# Altium footprint library General.PCBLIB: 130 footprints (part 1 of 9)
Each footprint in its own frame and in the unit in brackets; x right, y up, seen from the top. Pads: shape width x height; smd on the part's side, far side on the other; paste and mask are expansions set on the pad; w line width, h text height; cw(c..) or ccw(c..) is an arc to the next point about the centre after c.
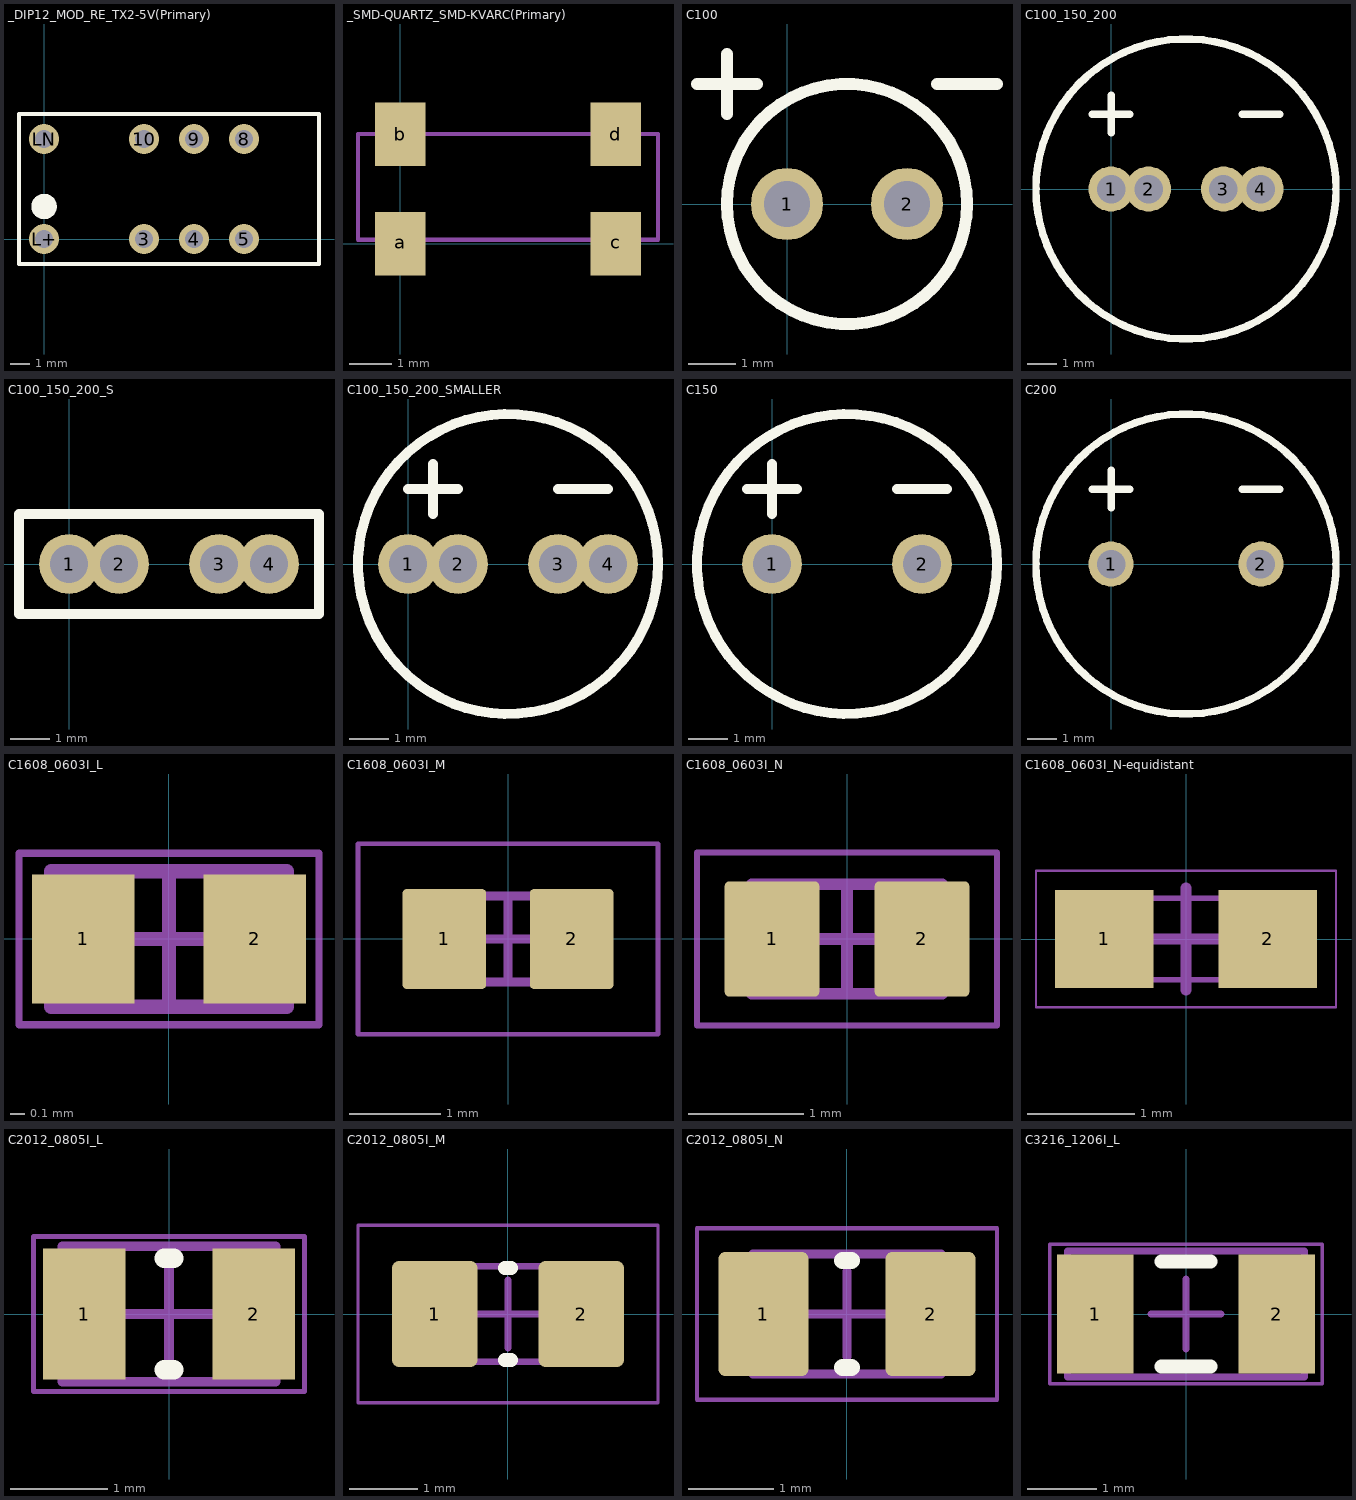
[diagram p0: the footprints below, top view; thin cyan lines are the x and y axes]

## _DIP12_MOD_RE_TX2-5V(Primary) [mil]
pads (8):
  round 60 hole 36: 3(200,0) 4(300,0) 5(400,0) 8(400,200) 9(300,200) 10(200,200) L+(0,0) LN(0,200)
Top Overlay:
  circle w25: c0,65 r13
  lines w8: -50,-50 -50,250 550,250 550,-50 -50,-50
Top DesignatorDoc:
  text ".Designator" at 100,100 h47.24

## _SMD-QUARTZ_SMD-KVARC(Primary) [mm]
pads (4):
  rect 1.2x1.5 smd: a(0,0) b(0,2.6) c(5.1,0) d(5.1,2.6)
Board Outline:
  lines w0.1: -1,0.1 -1,2.6 6.1,2.6 6.1,0.1 -1,0.1
Top DesignatorDoc:
  text ".Designator" at 2.54,1.27 h1.2

## C100 [mil]
pads (2):
  round 60 hole 38: 1(0,0) 2(100,0)
Top Overlay:
  circle w10: c50,0 r100
  lines w10: -75,100 -25,100 ; -50,75 -50,125 ; 125,100 175,100
Top DesignatorDoc:
  text ".Designator" at 50,0 h47.24

## C100_150_200 [mil]
pads (4):
  round 60 hole 38: 1(0,0) 2(50,0) 3(150,0) 4(200,0)
Top Overlay:
  circle w10: c100,0 r200
  lines w10: -25,100 25,100 ; 0,75 0,125 ; 175,100 225,100
Top DesignatorDoc:
  text ".Designator" at 100,0 h47.24

## C100_150_200_S [mil]
pads (4):
  round 60 hole 38: 1(0,0) 2(50,0) 3(150,0) 4(200,0)
Top Overlay:
  lines w10: -50,-50 -50,50 250,50 250,-50 -50,-50
Top DesignatorDoc:
  text ".Designator" at 100,0 h47.24

## C100_150_200_SMALLER [mil]
pads (4):
  round 60 hole 38: 1(0,0) 2(50,0) 3(150,0) 4(200,0)
Top Overlay:
  circle w10: c100,0 r150
  lines w10: 0,75 50,75 ; 25,50 25,100 ; 150,75 200,75
Top DesignatorDoc:
  text ".Designator" at 100,0 h47.24

## C150 [mil]
pads (2):
  round 60 hole 38: 1(0,0) 2(150,0)
Top Overlay:
  circle w10: c75,0 r150
  lines w10: -25,75 25,75 ; 0,50 0,100 ; 125,75 175,75
Top DesignatorDoc:
  text ".Designator" at 75,0 h47.24

## C200 [mil]
pads (2):
  round 60 hole 38: 1(0,0) 2(200,0)
Top Overlay:
  circle w10: c100,0 r200
  lines w10: -25,100 25,100 ; 0,75 0,125 ; 175,100 225,100
Top DesignatorDoc:
  text ".Designator" at 100,0 h47.24

## C1608_0603I_L [mm] "Chip Capacitor, 2-Leads, Body 1.57x0.85mm, IPC High Density"
height 0.95
pads (2):
  rect 0.72x0.9 smd: 1(-0.6,0) 2(0.6,0)
Top Body, 3D Models:
  lines w0.1: -0.825,-0.475 0.825,-0.475 0.825,0.475 -0.825,0.475 -0.825,-0.475
Top Courtyard:
  lines w0.05: -1.05,-0.6 1.05,-0.6 1.05,0.6 -1.05,0.6 -1.05,-0.6
  lines w0.1: -0.475,0 0.475,0 ; 0,-0.475 0,0.475
Top DesignatorDoc:
  text ".Designator" at 0,0 h1.2
3D body "C0603(1608)_L.step": height 0.95, standoff 0, extent -0.825,-0.475 0.825,0.475

## C1608_0603I_M [mm] "Chip Capacitor, 2-Leads, Body 1.57x0.85mm, IPC Low Density"
height 0.95
pads (2):
  rrect10% 0.92x1.1 smd: 1(-0.7,0) 2(0.7,0)
Top Body, 3D Models:
  lines w0.1: -0.825,-0.475 -0.825,0.475 0.825,0.475 0.825,-0.475 -0.825,-0.475
Top Courtyard:
  lines w0.05: -1.65,-1.05 -1.65,1.05 1.65,1.05 1.65,-1.05 -1.65,-1.05
  lines w0.1: -0.475,0 0.475,0 ; 0,-0.475 0,0.475
Top DesignatorDoc:
  text ".Designator" at 0,0 h1.2
3D body "C0603(1608)_M.step": height 0.95, standoff 0, extent -0.825,-0.475 0.825,0.475

## C1608_0603I_N [mm] "Chip Capacitor, 2-Leads, Body 1.57x0.85mm, IPC Medium Density"
height 0.95
pads (2):
  rrect10% 0.82x1 smd: 1(-0.65,0) 2(0.65,0)
Top Body, 3D Models:
  lines w0.1: -0.825,-0.475 -0.825,0.475 0.825,0.475 0.825,-0.475 -0.825,-0.475
Top Courtyard:
  lines w0.05: -1.3,-0.75 -1.3,0.75 1.3,0.75 1.3,-0.75 -1.3,-0.75
  lines w0.1: -0.475,0 0.475,0 ; 0,-0.475 0,0.475
Top DesignatorDoc:
  text ".Designator" at 0,0 h1.2
3D body "C0603N.step": height 0.95, standoff 0, extent -0.825,-0.475 0.825,0.475

## C1608_0603I_N-equidistant [mil] "Chip Capacitor, 2-Leads, Body 1.57x0.85mm, IPC Medium Density"
height 37.4
pads (2):
  rect 36x36 smd: 1(-30,0.01) 2(30,0.01)
Top Body, 3D Models:
  lines w2: -30,-15 30,-15 30,15 -30,15 -30,-15
Top Courtyard:
  lines w0.79: -55,-25 -55,25 55,25 55,-25 -55,-25
  lines w3.94: -18.7,0 18.7,0 ; 0,-18.7 0,18.7
Top DesignatorDoc:
  text ".Designator" at 0,0 h47.24
3D body "C0603(1608)_M.step": height 37.4, standoff 0, extent -32.48,-18.7 32.48,18.7

## C2012_0805I_L [mm] "Chip Capacitor, 2-Leads, Body 2.05x1.25mm, IPC High Density"
height 1.4
pads (2):
  rect 0.85x1.35 smd: 1(-0.875,0) 2(0.875,0)
Top Overlay:
  lines w0.2: -0.05,-0.575 0.05,-0.575 ; -0.05,0.575 0.05,0.575
Top Body, 3D Models:
  lines w0.1: -1.1,-0.7 -1.1,0.7 1.1,0.7 1.1,-0.7 -1.1,-0.7
Top Courtyard:
  lines w0.05: -1.4,-0.8 -1.4,0.8 1.4,0.8 1.4,-0.8 -1.4,-0.8
  lines w0.1: -0.5,0 0.5,0 ; 0,-0.5 0,0.5
Top DesignatorDoc:
  text ".Designator" at 0,0 h1.2
3D body "C0805_L.step": height 1.4, standoff 0, extent -1.1,-0.7 1.1,0.7

## C2012_0805I_M [mm] "Chip Capacitor, 2-Leads, Body 2.05x1.25mm, IPC Low Density"
height 1.4
pads (2):
  rrect15% 1.25x1.55 smd: 1(-1.075,0) 2(1.075,0)
Top Overlay:
  lines w0.2: -0.05,-0.675 0.05,-0.675 ; -0.05,0.675 0.05,0.675
Top Body, 3D Models:
  lines w0.1: -1.1,-0.7 1.1,-0.7 1.1,0.7 -1.1,0.7 -1.1,-0.7
Top Courtyard:
  lines w0.05: -2.2,-1.3 2.2,-1.3 2.2,1.3 -2.2,1.3 -2.2,-1.3
  lines w0.1: -0.5,0 0.5,0 ; 0,-0.5 0,0.5
Top DesignatorDoc:
  text ".Designator" at 0,0 h1.2
3D body "C0805_M.step": height 1.4, standoff 0, extent -1.1,-0.7 1.1,0.7

## C2012_0805I_N [mm] "Chip Capacitor, 2-Leads, Body 2.05x1.25mm, IPC Medium Density"
height 1.4
pads (2):
  rrect15% 1.05x1.45 smd: 1(-0.975,0) 2(0.975,0)
Top Overlay:
  lines w0.2: -0.05,-0.625 0.05,-0.625 ; -0.05,0.625 0.05,0.625
Top Body, 3D Models:
  lines w0.1: -1.1,-0.7 -1.1,0.7 1.1,0.7 1.1,-0.7 -1.1,-0.7
Top Courtyard:
  lines w0.05: -1.75,-1 -1.75,1 1.75,1 1.75,-1 -1.75,-1
  lines w0.1: -0.5,0 0.5,0 ; 0,-0.5 0,0.5
Top DesignatorDoc:
  text ".Designator" at 0,0 h1.2
3D body "C0805_N.step": height 1.4, standoff 0, extent -1.1,-0.7 1.1,0.7

## C3216_1206I_L [mm] "Chip Capacitor, 2-Leads, Body 3.20x1.60mm, IPC High Density"
height 1.8
pads (2):
  rect 1.1x1.7 smd: 1(-1.3,0) 2(1.3,0)
Top Overlay:
  lines w0.2: -0.35,-0.75 0.35,-0.75 ; -0.35,0.75 0.35,0.75
Top Body, 3D Models:
  lines w0.1: -1.7,-0.9 -1.7,0.9 1.7,0.9 1.7,-0.9 -1.7,-0.9
Top Courtyard:
  lines w0.05: -1.95,-1 -1.95,1 1.95,1 1.95,-1 -1.95,-1
  lines w0.1: -0.5,0 0.5,0 ; 0,-0.5 0,0.5
Top DesignatorDoc:
  text ".Designator" at 0,0 h1.2
3D body "C1206(3216)_L.step": height 1.8, standoff 0, extent -1.7,-0.9 1.7,0.9